# Altium footprint library 13-IC Packages-3pic1.PcbLib: 49 footprints (part 2 of 4)
Each footprint in its own frame and in the unit in brackets; x right, y up, seen from the top. Pads: shape width x height; smd on the part's side, far side on the other; paste and mask are expansions set on the pad; w line width, h text height; cw(c..) or ccw(c..) is an arc to the next point about the centre after c.
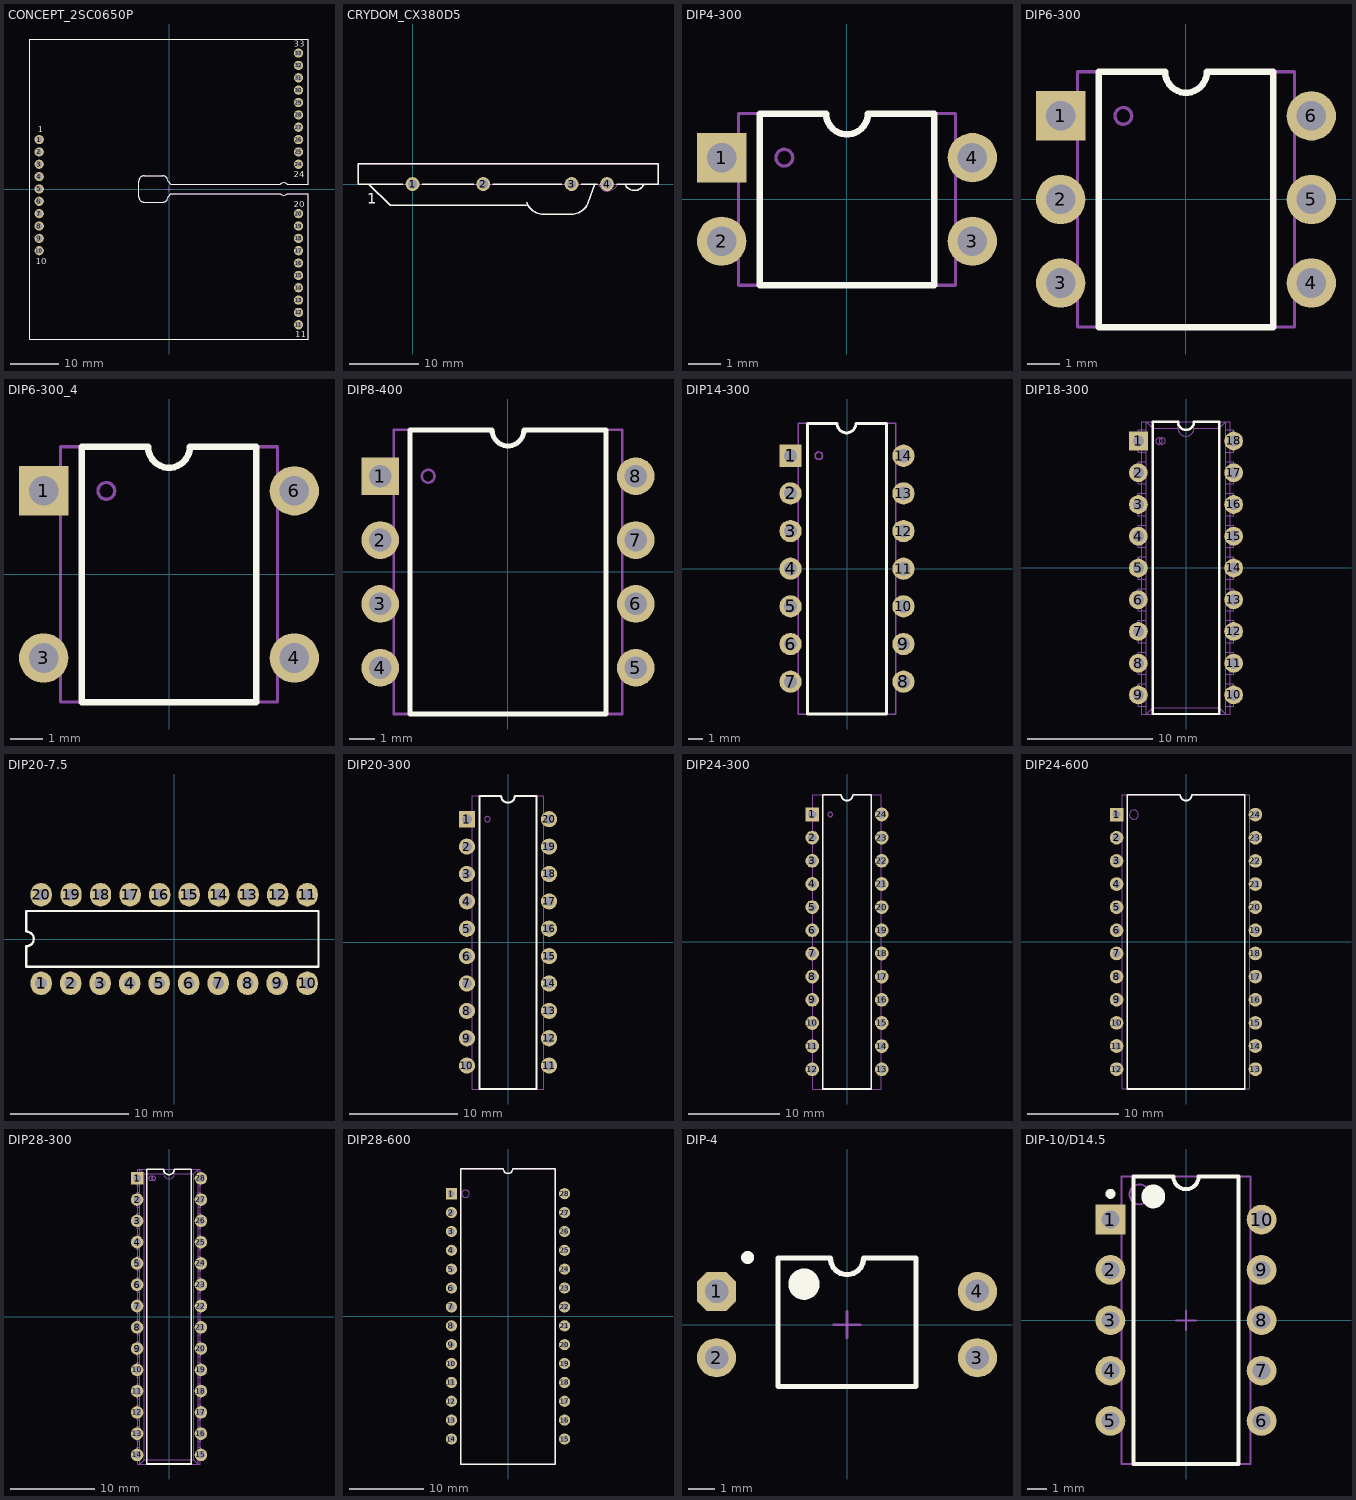
[diagram p1: the footprints below, top view; thin cyan lines are the x and y axes]

## CONCEPT_2SC0650P [mm] "Dual-Channel High-Power High-Frequency SCALE-2 Driver Core"
height 6.5
pads (30):
  round 1.9 hole 1.2: 1(-26.7,10.17) 2(-26.7,7.63) 3(-26.7,5.09) 4(-26.7,2.55) 5(-26.7,0.01) 6(-26.7,-2.53) 7(-26.7,-5.07) 8(-26.7,-7.61) 9(-26.7,-10.15) 10(-26.7,-12.69) 11(26.64,-27.93) 12(26.64,-25.39) 13(26.64,-22.85) 14(26.64,-20.31) 15(26.64,-17.77) 16(26.64,-15.23) 17(26.64,-12.69) 18(26.64,-10.15) 19(26.64,-7.61) 20(26.64,-5.07) 24(26.64,5.09) 25(26.64,7.63) 26(26.64,10.17) 27(26.64,12.71) 28(26.64,15.25) 29(26.64,17.79) 30(26.64,20.33) 31(26.64,22.87) 32(26.64,25.41) 33(26.64,27.95)
Top Overlay:
  lines w0.2: -28.6,-30.85 -28.6,30.85 28.6,30.85 28.6,1 24.35,1 ccw(c23.6,0) 22.85,1 0.4,1 -0.2,1.6 ccw(c-1.3,1.6) -1.3,2.7 -5.1,2.7 ccw(c-5.1,1.6) -6.2,1.6 -6.2,-1.6 ccw(c-5.1,-1.6) -5.1,-2.7 -1.3,-2.7 ccw(c-1.3,-1.6) -0.2,-1.6 0.4,-1 22.85,-1 ccw(c23.6,0) 24.35,-1 28.6,-1 28.6,-30.85 -28.6,-30.85
  text "11" at 25.94,-30.497 h1.27
  text "24" at 25.684,2.387 h1.27
  text "20" at 25.696,-3.767 h1.27
  text "33" at 25.696,29.253 h1.27
  text "10" at -27.453,-15.483 h1.27
  text "1" at -26.973,11.627 h1.27
Mechanical 8:
  lines w0.1: -27.2,-12.69 -26.7,-12.69 ; -27.2,-10.15 -26.7,-10.15 ; -27.2,-7.61 -26.7,-7.61 ; -27.2,-5.07 -26.7,-5.07 ; -27.2,-2.53 -26.7,-2.53 ; -27.2,0.01 -26.7,0.01 ; -27.2,2.55 -26.7,2.55 ; -27.2,5.09 -26.7,5.09 ; -27.2,7.63 -26.7,7.63 ; -27.2,10.17 -26.7,10.17 ; -26.7,-13.19 -26.7,-12.69 ; -26.7,-12.19 -26.7,-12.69 ; -26.7,-10.65 -26.7,-10.15 ; -26.7,-9.65 -26.7,-10.15 ; -26.7,-8.11 -26.7,-7.61 ; -26.7,-7.11 -26.7,-7.61 ; -26.7,-5.57 -26.7,-5.07 ; -26.7,-4.57 -26.7,-5.07 ; -26.7,-3.03 -26.7,-2.53 ; -26.7,-2.03 -26.7,-2.53 ; -26.7,-0.49 -26.7,0.01 ; -26.7,0.51 -26.7,0.01 ; -26.7,2.05 -26.7,2.55 ; -26.7,3.05 -26.7,2.55 ; -26.7,4.59 -26.7,5.09 ; -26.7,5.59 -26.7,5.09 ; -26.7,7.13 -26.7,7.63 ; -26.7,8.13 -26.7,7.63 ; -26.7,9.67 -26.7,10.17 ; -26.7,10.67 -26.7,10.17 ; -26.2,-12.69 -26.7,-12.69 ; -26.2,-10.15 -26.7,-10.15 ; -26.2,-7.61 -26.7,-7.61 ; -26.2,-5.07 -26.7,-5.07 ; -26.2,-2.53 -26.7,-2.53 ; -26.2,0.01 -26.7,0.01 ; -26.2,2.55 -26.7,2.55 ; -26.2,5.09 -26.7,5.09 ; -26.2,7.63 -26.7,7.63 ; -26.2,10.17 -26.7,10.17 ; -0.5,0 0,0 ; 0,-0.5 0,0 ; 0,0.5 0,0 ; 0.5,0 0,0 ; 26.14,-27.93 26.64,-27.93 ; 26.14,-25.39 26.64,-25.39 ; 26.14,-22.85 26.64,-22.85 ; 26.14,-20.31 26.64,-20.31 ; 26.14,-17.77 26.64,-17.77 ; 26.14,-15.23 26.64,-15.23 ; 26.14,-12.69 26.64,-12.69 ; 26.14,-10.15 26.64,-10.15 ; 26.14,-7.61 26.64,-7.61 ; 26.14,-5.07 26.64,-5.07 ; 26.14,5.09 26.64,5.09 ; 26.14,7.63 26.64,7.63 ; 26.14,10.17 26.64,10.17 ; 26.14,12.71 26.64,12.71 ; 26.14,15.25 26.64,15.25 ; 26.14,17.79 26.64,17.79 ; 26.14,20.33 26.64,20.33 ; 26.14,22.87 26.64,22.87 ; 26.14,25.41 26.64,25.41 ; 26.14,27.95 26.64,27.95 ; 26.64,-28.43 26.64,-27.93 ; 26.64,-27.43 26.64,-27.93 ; 26.64,-25.89 26.64,-25.39 ; 26.64,-24.89 26.64,-25.39 ; 26.64,-23.35 26.64,-22.85 ; 26.64,-22.35 26.64,-22.85 ; 26.64,-20.81 26.64,-20.31 ; 26.64,-19.81 26.64,-20.31 ; 26.64,-18.27 26.64,-17.77 ; 26.64,-17.27 26.64,-17.77 ; 26.64,-15.73 26.64,-15.23 ; 26.64,-14.73 26.64,-15.23 ; 26.64,-13.19 26.64,-12.69 ; 26.64,-12.19 26.64,-12.69 ; 26.64,-10.65 26.64,-10.15 ; 26.64,-9.65 26.64,-10.15 ; 26.64,-8.11 26.64,-7.61 ; 26.64,-7.11 26.64,-7.61 ; 26.64,-5.57 26.64,-5.07 ; 26.64,-4.57 26.64,-5.07 ; 26.64,4.59 26.64,5.09 ; 26.64,5.59 26.64,5.09 ; 26.64,7.13 26.64,7.63 ; 26.64,8.13 26.64,7.63 ; 26.64,9.67 26.64,10.17 ; 26.64,10.67 26.64,10.17 ; 26.64,12.21 26.64,12.71 ; 26.64,13.21 26.64,12.71 ; 26.64,14.75 26.64,15.25 ; 26.64,15.75 26.64,15.25 ; 26.64,17.29 26.64,17.79 ; 26.64,18.29 26.64,17.79 ; 26.64,19.83 26.64,20.33 ; 26.64,20.83 26.64,20.33 ; 26.64,22.37 26.64,22.87 ; 26.64,23.37 26.64,22.87 ; 26.64,24.91 26.64,25.41 ; 26.64,25.91 26.64,25.41 ; 26.64,27.45 26.64,27.95 ; 26.64,28.45 26.64,27.95 ; 27.14,-27.93 26.64,-27.93 ; 27.14,-25.39 26.64,-25.39 ; 27.14,-22.85 26.64,-22.85 ; 27.14,-20.31 26.64,-20.31 ; 27.14,-17.77 26.64,-17.77 ; 27.14,-15.23 26.64,-15.23 ; 27.14,-12.69 26.64,-12.69 ; 27.14,-10.15 26.64,-10.15 ; 27.14,-7.61 26.64,-7.61 ; 27.14,-5.07 26.64,-5.07 ; 27.14,5.09 26.64,5.09 ; 27.14,7.63 26.64,7.63 ; 27.14,10.17 26.64,10.17 ; 27.14,12.71 26.64,12.71 ; 27.14,15.25 26.64,15.25 ; 27.14,17.79 26.64,17.79 ; 27.14,20.33 26.64,20.33 ; 27.14,22.87 26.64,22.87 ; 27.14,25.41 26.64,25.41 ; 27.14,27.95 26.64,27.95
Mechanical 14:
  lines w0.1: -28.6,-30.85 -28.6,30.85 28.6,30.85 28.6,1 24.35,1 ccw(c23.6,0) 22.85,1 0.4,1 -0.2,1.6 ccw(c-1.3,1.6) -1.3,2.7 -5.1,2.7 ccw(c-5.1,1.6) -6.2,1.6 -6.2,-1.6 ccw(c-5.1,-1.6) -5.1,-2.7 -1.3,-2.7 ccw(c-1.3,-1.6) -0.2,-1.6 0.4,-1 22.85,-1 ccw(c23.6,0) 24.35,-1 28.6,-1 28.6,-30.85 -28.6,-30.85
  text "11" at 25.94,-30.497 h1.27
  text "24" at 25.684,2.387 h1.27
  text "20" at 25.696,-3.767 h1.27
  text "33" at 25.696,29.253 h1.27
  text "10" at -27.453,-15.483 h1.27
  text "1" at -26.973,11.627 h1.27
3D body "CONCEPT_2SC0650P.stp": height 6.68, standoff -2.54, extent -28.6,-30.85 28.6,30.85

## CRYDOM_CX380D5 [mm] "CRYDOM CX Serie, 4 Leads, Body 43.1 x 7.6mm, SIP Solid State Relay"
height 26.7
pads (4):
  round 2 hole 1.3: 1(0,0) 2(10.16,0) 3(22.86,0) 4(27.94,0)
Top Overlay:
  lines w0.2: -6.263,0 -3.215,-3.048 16.581,-3.048 ; -1.4,0 -7.834,0 -7.834,2.911 35.266,2.911 35.266,0 29.34,0 ; 1.4,0 8.76,0 ; 11.56,0 21.46,0 ; 16.379,-2.605 ccw(c18.781,-1.778) 18.781,-4.318 22.852,-4.318 ccw(c22.852,-1.778) 25.253,-2.605 26.15,0 ; 24.26,0 26.54,0 ; 30.534,0 ccw(c31.89,0.544) 33.11,-0.258 33.28,0
  text "1" at -6.5,-2.8 h1.5
Mechanical 8:
  lines w0.1: -0.5,0 0,0 ; 0,-0.5 0,0 ; 0,0.5 0,0 ; 0.5,0 0,0 ; 9.66,0 10.16,0 ; 10.16,-0.5 10.16,0 ; 10.16,0.5 10.16,0 ; 10.66,0 10.16,0 ; 22.36,0 22.86,0 ; 22.86,-0.5 22.86,0 ; 22.86,0.5 22.86,0 ; 23.36,0 22.86,0 ; 27.44,0 27.94,0 ; 27.94,-0.5 27.94,0 ; 27.94,0.5 27.94,0 ; 28.44,0 27.94,0
Mechanical 14:
  lines w0.1: -6.263,0 -3.215,-3.048 16.581,-3.048 ; 16.379,-2.605 ccw(c18.781,-1.778) 18.781,-4.318 22.852,-4.318 ccw(c22.852,-1.778) 25.253,-2.605 26.15,0 ; 26.695,0 26.936,-0.365 ccw(c28.08,0.544) 29.435,0 ; 27.053,-0.495 ccw(c27.94,0) 28.48,-0.861 ; 30.534,0 ccw(c31.89,0.544) 33.11,-0.258 33.28,0 ; -7.834,0 35.266,0 35.266,2.911 -7.834,2.911 -7.834,0
  text "1" at -6.5,-2.8 h1.5
3D body "CRYDOM_CX380D5.stp": height 26.7, standoff -5.08, extent -7.834,-4.318 35.266,2.911

## DIP4-300 [mm] "DIP 4 Leads, Row Spacing 7.62 mm; Pitch 2.54 mm"
height 5.08
pads (4):
  rect 1.5x1.5 hole 0.9: 1(-3.81,1.27)
  round 1.5 hole 0.9: 2(-3.81,-1.27) 3(3.81,-1.27) 4(3.81,1.27)
Top Overlay:
  lines w0.2: -0.635,2.61 ccw(c0,2.61) 0.635,2.61 ; -0.635,2.61 ccw(c0,2.61) 0.635,2.61 ; -0.635,2.61 -2.65,2.61 -2.65,-2.61 2.65,-2.61 2.65,2.61 0.635,2.61
Mechanical 14:
  circle w0.1: c-1.905,1.27 r0.254
  lines w0.1: -3.3,-2.61 -3.3,2.61 -0.635,2.61 ccw(c0,2.61) 0.635,2.61 3.3,2.61 3.3,-2.61 -3.3,-2.61
3D body "DIP4-300.stp": height 5.33, standoff -3.3, extent -3.935,-2.54 3.935,2.54

## DIP6-300 [mm] "DIP 6 Leads, Row Spacing 7.62 mm; Pitch 2.54 mm"
height 5.08
pads (6):
  rect 1.5x1.5 hole 0.9: 1(-3.81,2.54)
  round 1.5 hole 0.9: 2(-3.81,0) 3(-3.81,-2.54) 4(3.81,-2.54) 5(3.81,0) 6(3.81,2.54)
Top Overlay:
  lines w0.2: -0.635,3.88 ccw(c0,3.88) 0.635,3.88 ; -0.635,3.88 ccw(c0,3.88) 0.635,3.88 ; -0.635,3.88 -2.65,3.88 -2.65,-3.88 2.65,-3.88 2.65,3.88 0.635,3.88
Mechanical 14:
  circle w0.1: c-1.905,2.54 r0.254
  lines w0.1: -3.3,-3.88 -3.3,3.88 -0.635,3.88 ccw(c0,3.88) 0.635,3.88 3.3,3.88 3.3,-3.88 -3.3,-3.88
3D body "DIP6-300.stp": height 5.33, standoff -3.3, extent -3.935,-3.81 3.935,3.81

## DIP6-300_4 [mm] "DIP 6, 4 Leads, Row Spacing 7.62 mm; Pitch 2.54 mm"
height 5.08
pads (4):
  rect 1.5x1.5 hole 0.9: 1(-3.81,2.54)
  round 1.5 hole 0.9: 3(-3.81,-2.54) 4(3.81,-2.54) 6(3.81,2.54)
Top Overlay:
  lines w0.2: -0.635,3.88 ccw(c0,3.88) 0.635,3.88 ; -0.635,3.88 ccw(c0,3.88) 0.635,3.88 ; -0.635,3.88 -2.65,3.88 -2.65,-3.88 2.65,-3.88 2.65,3.88 0.635,3.88
Mechanical 14:
  circle w0.1: c-1.905,2.54 r0.254
  lines w0.1: -3.3,-3.88 -3.3,3.88 -0.67,3.88 ccw(c-0.035,3.88) 0.6,3.88 3.3,3.88 3.3,-3.88 -3.3,-3.88
3D body "DIP6-300_4.stp": height 5.33, standoff -3.3, extent -3.935,-3.81 3.935,3.81

## DIP8-400 [mm] "DIP 8 Leads, Row Spacing 10.16mm; Pitch 2.54 mm"
height 5.08
pads (8):
  rect 1.5x1.5 hole 0.9: 1(-5.08,3.81)
  round 1.5 hole 0.9: 2(-5.08,1.27) 3(-5.08,-1.27) 4(-5.08,-3.81) 5(5.08,-3.81) 6(5.08,-1.27) 7(5.08,1.27) 8(5.08,3.81)
Top Overlay:
  lines w0.2: -3.9,-5.65 -3.9,5.65 -0.635,5.65 ccw(c0,5.65) 0.635,5.65 3.9,5.65 3.9,-5.65 -3.9,-5.65
Mechanical 14:
  circle w0.1: c-3.175,3.81 r0.254
  lines w0.1: -4.55,-5.65 4.55,-5.65 4.55,5.65 0.62,5.65 cw(c-0.015,5.65) -0.65,5.65 -4.55,5.65 -4.55,-5.65
3D body "DIP8-400.stp": height 5.33, standoff -3.3, extent -5.205,-5.65 5.205,5.65

## DIP14-300 [mm] "DIP 14 Leads, Row Spacing 7.62 mm; Pitch 2.54 mm"
height 5.08
pads (14):
  rect 1.5x1.5 hole 0.9: 1(-3.81,7.62)
  round 1.5 hole 0.9: 2(-3.81,5.08) 3(-3.81,2.54) 4(-3.81,0) 5(-3.81,-2.54) 6(-3.81,-5.08) 7(-3.81,-7.62) 8(3.81,-7.62) 9(3.81,-5.08) 10(3.81,-2.54) 11(3.81,0) 12(3.81,2.54) 13(3.81,5.08) 14(3.81,7.62)
Top Overlay:
  lines w0.2: -0.685,9.8 -2.65,9.8 -2.65,-9.8 2.65,-9.8 2.65,9.8 ; -0.67,9.8 ccw(c-0.035,9.8) 0.6,9.8 2.615,9.8
Mechanical 14:
  circle w0.1: c-1.905,7.62 r0.254
  lines w0.1: -3.3,-9.8 -3.3,9.8 -0.67,9.8 ccw(c-0.035,9.8) 0.6,9.8 3.3,9.8 3.3,-9.8 -3.3,-9.8
3D body "DIP14-300.stp": height 5.33, standoff -3.3, extent -3.935,-9.845 3.935,9.845

## DIP18-300 [mm] "DIP 18 Leads, Row Spacing 7.62 mm; Pitch 2.54 mm"
height 5.08
pads (18):
  rect 1.5x1.5 hole 0.9: 1(-3.81,10.16)
  round 1.5 hole 0.9: 2(-3.81,7.62) 3(-3.81,5.08) 4(-3.81,2.54) 5(-3.81,0) 6(-3.81,-2.54) 7(-3.81,-5.08) 8(-3.81,-7.62) 9(-3.81,-10.16) 10(3.81,-10.16) 11(3.81,-7.62) 12(3.81,-5.08) 13(3.81,-2.54) 14(3.81,0) 15(3.81,2.54) 16(3.81,5.08) 17(3.81,7.62) 18(3.81,10.16)
Top Overlay:
  lines w0.2: -2.65,-11.685 2.65,-11.685 2.65,11.685 0.635,11.685 cw(c0,11.685) -0.635,11.685 -2.65,11.685 -2.65,-11.685
Mechanical 8:
  circle w0.05: c-2.159,10.16 r0.254
  lines w0.05: -3.175,-11.05 -3.81,-11.05 -3.81,-10.44 -3.935,-10.44 -3.935,-9.88 -3.81,-9.88 -3.81,-9.27 -3.175,-9.27 ; -3.175,-8.51 -3.81,-8.51 -3.81,-7.9 -3.935,-7.9 -3.935,-7.34 -3.81,-7.34 -3.81,-6.73 -3.175,-6.73 ; -3.175,-5.97 -3.81,-5.97 -3.81,-5.36 -3.935,-5.36 -3.935,-4.8 -3.81,-4.8 -3.81,-4.19 -3.175,-4.19 ; -3.175,-3.43 -3.81,-3.43 -3.81,-2.82 -3.935,-2.82 -3.935,-2.26 -3.81,-2.26 -3.81,-1.65 -3.175,-1.65 ; -3.175,-0.89 -3.81,-0.89 -3.81,-0.28 -3.935,-0.28 -3.935,0.28 -3.81,0.28 -3.81,0.89 -3.175,0.89 ; -3.175,1.65 -3.81,1.65 -3.81,2.26 -3.935,2.26 -3.935,2.82 -3.81,2.82 -3.81,3.43 -3.175,3.43 ; -3.175,4.19 -3.81,4.19 -3.81,4.8 -3.935,4.8 -3.935,5.36 -3.81,5.36 -3.81,5.97 -3.175,5.97 ; -3.175,6.73 -3.81,6.73 -3.81,7.34 -3.935,7.34 -3.935,7.9 -3.81,7.9 -3.81,8.51 -3.175,8.51 ; -3.175,9.27 -3.81,9.27 -3.81,9.88 -3.935,9.88 -3.935,10.44 -3.81,10.44 -3.81,11.05 -3.175,11.05 ; -0.635,11.685 -0.635,11.177 ; 0.635,11.685 0.635,11.177 ; 3.175,-11.05 3.81,-11.05 3.81,-10.44 3.935,-10.44 3.935,-9.88 3.81,-9.88 3.81,-9.27 3.175,-9.27 ; 3.175,-8.51 3.81,-8.51 3.81,-7.9 3.935,-7.9 3.935,-7.34 3.81,-7.34 3.81,-6.73 3.175,-6.73 ; 3.175,-5.97 3.81,-5.97 3.81,-5.36 3.935,-5.36 3.935,-4.8 3.81,-4.8 3.81,-4.19 3.175,-4.19 ; 3.175,-3.43 3.81,-3.43 3.81,-2.82 3.935,-2.82 3.935,-2.26 3.81,-2.26 3.81,-1.65 3.175,-1.65 ; 3.175,-0.89 3.81,-0.89 3.81,-0.28 3.935,-0.28 3.935,0.28 3.81,0.28 3.81,0.89 3.175,0.89 ; 3.175,1.65 3.81,1.65 3.81,2.26 3.935,2.26 3.935,2.82 3.81,2.82 3.81,3.43 3.175,3.43 ; 3.175,4.19 3.81,4.19 3.81,4.8 3.935,4.8 3.935,5.36 3.81,5.36 3.81,5.97 3.175,5.97 ; 3.175,6.73 3.81,6.73 3.81,7.34 3.935,7.34 3.935,7.9 3.81,7.9 3.81,8.51 3.175,8.51 ; 3.175,9.27 3.81,9.27 3.81,9.88 3.935,9.88 3.935,10.44 3.81,10.44 3.81,11.05 3.175,11.05 ; -3.175,-11.685 3.175,-11.685 ; -3.175,-11.685 -3.175,11.685 ; -3.175,-11.685 -2.667,-11.177 ; -3.175,11.685 3.175,11.685 ; -3.175,11.685 -2.667,11.177 ; -2.667,-11.177 2.667,-11.177 ; -2.667,-11.177 -2.667,11.177 ; -2.667,11.177 -0.635,11.177 ; -0.635,11.177 ccw(c0,11.177) 0.635,11.177 ; 0.635,11.177 2.667,11.177 ; 2.667,-11.177 2.667,11.177 ; 2.667,-11.177 3.175,-11.685 ; 2.667,11.177 3.175,11.685 ; 3.175,-11.685 3.175,11.685
Mechanical 14:
  circle w0.1: c-1.905,10.16 r0.254
  lines w0.1: -3.555,-11.685 -3.555,11.685 -0.635,11.685 ccw(c0,11.685) 0.635,11.685 3.555,11.685 3.555,-11.685 -3.555,-11.685
3D body "DIP18-300.stp": height 5.33, standoff -3.3, extent -3.935,-11.685 3.935,11.685

## DIP20-7.5 [mm]
height 5.08
pads (20):
  oval 1.8x2 hole 1: 1(-11.27,-3.75) 2(-8.77,-3.75) 3(-6.27,-3.75) 4(-3.77,-3.75) 5(-1.27,-3.75) 6(1.23,-3.75) 7(3.73,-3.75) 8(6.23,-3.75) 9(8.73,-3.75) 10(11.27,-3.75) 11(11.27,3.75) 12(8.77,3.75) 13(6.27,3.75) 14(3.77,3.75) 15(1.27,3.75) 16(-1.23,3.75) 17(-3.73,3.75) 18(-6.23,3.75) 19(-8.73,3.75) 20(-11.27,3.75)
Top Overlay:
  lines w0.2: -12.52,-2.36 -12.52,-0.62 ccw(c-12.52,0.005) -12.52,0.63 -12.52,2.37 12.23,2.37 12.23,-2.36 -12.52,-2.36
3D body "DIP20-300.stp": height 5.33, standoff -3.3, extent -13.435,-3.884 13.485,3.986

## DIP20-300 [mm] "DIP 20 Leads, Row Spacing 7.62 mm; Pitch 2.54 mm"
height 5.08
pads (20):
  rect 1.5x1.5 hole 0.9: 1(-3.81,11.43)
  round 1.5 hole 0.9: 2(-3.81,8.89) 3(-3.81,6.35) 4(-3.81,3.81) 5(-3.81,1.27) 6(-3.81,-1.27) 7(-3.81,-3.81) 8(-3.81,-6.35) 9(-3.81,-8.89) 10(-3.81,-11.43) 11(3.81,-11.43) 12(3.81,-8.89) 13(3.81,-6.35) 14(3.81,-3.81) 15(3.81,-1.27) 16(3.81,1.27) 17(3.81,3.81) 18(3.81,6.35) 19(3.81,8.89) 20(3.81,11.43)
Top Overlay:
  lines w0.2: -2.65,-13.6 2.65,-13.6 2.65,13.6 0.635,13.6 cw(c0,13.6) -0.635,13.6 -2.65,13.6 -2.65,-13.6
Mechanical 14:
  circle w0.1: c-1.905,11.43 r0.254
  lines w0.1: -3.3,-13.6 3.3,-13.6 3.3,13.6 0.6,13.6 cw(c-0.035,13.6) -0.67,13.6 -3.3,13.6 -3.3,-13.6
3D body "DIP20-300.stp": height 5.33, standoff -3.3, extent -3.935,-13.46 3.935,13.46

## DIP24-300 [mm] "DIP 24 Leads, Row Spacing 7.62mm; Pitch 2.54mm"
height 5.08
pads (24):
  rect 1.5x1.5 hole 0.9: 1(-3.81,13.97)
  round 1.5 hole 0.9: 2(-3.81,11.43) 3(-3.81,8.89) 4(-3.81,6.35) 5(-3.81,3.81) 6(-3.81,1.27) 7(-3.81,-1.27) 8(-3.81,-3.81) 9(-3.81,-6.35) 10(-3.81,-8.89) 11(-3.81,-11.43) 12(-3.81,-13.97) 13(3.81,-13.97) 14(3.81,-11.43) 15(3.81,-8.89) 16(3.81,-6.35) 17(3.81,-3.81) 18(3.81,-1.27) 19(3.81,1.27) 20(3.81,3.81) 21(3.81,6.35) 22(3.81,8.89) 23(3.81,11.43) 24(3.81,13.97)
Top Overlay:
  lines w0.2: -2.65,-16.13 2.65,-16.13 2.65,16.13 0.635,16.13 cw(c0,16.13) -0.635,16.13 -2.65,16.13 -2.65,-16.13
Mechanical 14:
  circle w0.1: c-1.84,13.97 r0.254
  lines w0.1: -3.745,-16.13 3.745,-16.13 3.745,16.13 0.635,16.13 cw(c0,16.13) -0.635,16.13 -3.745,16.13 -3.745,-16.13
3D body "DIP24-300.stp": height 5.08, standoff -3.3, extent -3.935,-16.13 3.935,16.13

## DIP24-600 [mm] "24 Leads Dual In-Line Package, Row Spacing 15.24mm; Pitch 2.54mm"
height 5.1
pads (24):
  rect 1.5x1.5 hole 0.9: 1(-7.62,13.97)
  round 1.5 hole 0.9: 2(-7.62,11.43) 3(-7.62,8.89) 4(-7.62,6.35) 5(-7.62,3.81) 6(-7.62,1.27) 7(-7.62,-1.27) 8(-7.62,-3.81) 9(-7.62,-6.35) 10(-7.62,-8.89) 11(-7.62,-11.43) 12(-7.62,-13.97) 13(7.62,-13.97) 14(7.62,-11.43) 15(7.62,-8.89) 16(7.62,-6.35) 17(7.62,-3.81) 18(7.62,-1.27) 19(7.62,1.27) 20(7.62,3.81) 21(7.62,6.35) 22(7.62,8.89) 23(7.62,11.43) 24(7.62,13.97)
Top Overlay:
  lines w0.2: -6.45,-16.15 -6.45,16.15 -0.635,16.15 ccw(c0,16.15) 0.635,16.15 6.45,16.15 6.45,-16.15 -6.45,-16.15
Mechanical 14:
  circle w0.1: c-5.715,13.97 r0.5
  lines w0.1: -7,-16.15 -7,16.15 -0.635,16.15 ccw(c0,16.15) 0.635,16.15 7,16.15 7,-16.15 -7,-16.15
3D body "DIP24-600.stp": height 5.72, standoff -3.3, extent -7.745,-16 7.745,16

## DIP28-300 [mm] "DIP 28 Leads, Row Spacing 7.62mm; Pitch 2.54mm"
height 4.57
pads (28):
  rect 1.5x1.5 hole 0.9: 1(-3.81,16.51)
  round 1.5 hole 0.9: 2(-3.81,13.97) 3(-3.81,11.43) 4(-3.81,8.89) 5(-3.81,6.35) 6(-3.81,3.81) 7(-3.81,1.27) 8(-3.81,-1.27) 9(-3.81,-3.81) 10(-3.81,-6.35) 11(-3.81,-8.89) 12(-3.81,-11.43) 13(-3.81,-13.97) 14(-3.81,-16.51) 15(3.81,-16.51) 16(3.81,-13.97) 17(3.81,-11.43) 18(3.81,-8.89) 19(3.81,-6.35) 20(3.81,-3.81) 21(3.81,-1.27) 22(3.81,1.27) 23(3.81,3.81) 24(3.81,6.35) 25(3.81,8.89) 26(3.81,11.43) 27(3.81,13.97) 28(3.81,16.51)
Top Overlay:
  lines w0.2: -2.65,-17.59 -2.65,17.59 -0.635,17.59 ccw(c0,17.59) 0.635,17.59 2.65,17.59 2.65,-17.59 -2.65,-17.59
Mechanical 8:
  drawing of 205 lines, arcs and shapes, not listed
Mechanical 14:
  circle w0.1: c-1.84,16.51 r0.254
  lines w0.1: -3.745,-17.59 -3.745,17.59 -0.635,17.59 ccw(c0,17.59) 0.635,17.59 3.745,17.59 3.745,-17.59 -3.745,-17.59
3D body "DIP28-300.stp": height 4.57, standoff -3.3, extent -3.935,-17.59 3.935,17.59

## DIP28-600 [mm] "28 Leads Dual In-Line Package, Row Spacing 15.24mm; Pitch 2.54mm"
height 5.59
pads (28):
  rect 1.5x1.5 hole 0.9: 1(-7.62,16.51)
  round 1.5 hole 0.9: 2(-7.62,13.97) 3(-7.62,11.43) 4(-7.62,8.89) 5(-7.62,6.35) 6(-7.62,3.81) 7(-7.62,1.27) 8(-7.62,-1.27) 9(-7.62,-3.81) 10(-7.62,-6.35) 11(-7.62,-8.89) 12(-7.62,-11.43) 13(-7.62,-13.97) 14(-7.62,-16.51) 15(7.62,-16.51) 16(7.62,-13.97) 17(7.62,-11.43) 18(7.62,-8.89) 19(7.62,-6.35) 20(7.62,-3.81) 21(7.62,-1.27) 22(7.62,1.27) 23(7.62,3.81) 24(7.62,6.35) 25(7.62,8.89) 26(7.62,11.43) 27(7.62,13.97) 28(7.62,16.51)
Top Overlay:
  lines w0.2: -6.35,-19.875 -6.35,19.875 -0.635,19.875 ccw(c0,19.875) 0.635,19.875 6.35,19.875 6.35,-19.875 -6.35,-19.875
Mechanical 14:
  circle w0.1: c-5.715,16.51 r0.5
  lines w0.1: -6.35,-19.875 -6.35,19.875 -0.635,19.875 ccw(c0,19.875) 0.635,19.875 6.35,19.875 6.35,-19.875 -6.35,-19.875
3D body "DIP28-600.stp": height 5.33, standoff -3.3, extent -7.745,-19.875 7.745,19.875

## DIP-4 [mm] "DIP; 4 Leads; Row Spacing 7.62 mm; Pitch 2.54 mm"
height 5.6
pads (4):
  oct 1.5x1.5 hole 0.9: 1(-5,1.27)
  round 1.5 hole 0.9 mask+0.07: 2(-5,-1.27) 3(5,-1.27) 4(5,1.27)
Top Overlay:
  circle w0.6: c-1.65,1.55 r0.3
  circle w0.25: c-3.81,2.57 r0.125
  lines w0.2: -2.65,-2.375 2.65,-2.375 2.65,2.55 0.635,2.55 cw(c0,2.55) -0.635,2.55 -2.65,2.55 -2.65,-2.375
Mechanical 15:
  lines w0.1: -0.5,0 0.5,0 ; 0,-0.5 0,0.5
3D body "pc817.stp": height 4, standoff -2, extent -5.207,-2.277 5.183,2.303
3D body "2_1.stp": height 0.02, standoff -1.6, extent 4.007,-2.248 6.007,-0.248
3D body "2_1.stp": height 0.02, standoff -1.6, extent 4.007,0.292 6.007,2.292
3D body "2_1.stp": height 0.02, standoff -1.6, extent -5.993,0.292 -3.993,2.292
3D body "2_1.stp": height 0.02, standoff -1.6, extent -5.993,-2.248 -3.993,-0.248

## DIP-10/D14.5 [mm] "DIP; 10 Leads; Row Spacing 7.62 mm; Pitch 2.54 mm"
height 5.08
pads (10):
  rect 1.5x1.5 hole 0.9: 1(-3.81,5.08)
  round 1.5 hole 0.9 mask+0.07: 2(-3.81,2.54) 3(-3.81,0) 4(-3.81,-2.54) 5(-3.81,-5.08) 6(3.81,-5.08) 7(3.81,-2.54) 8(3.81,0) 9(3.81,2.54) 10(3.81,5.08)
Top Overlay:
  circle w0.6: c-1.65,6.25 r0.3
  circle w0.25: c-3.81,6.38 r0.125
  lines w0.2: -2.65,-7.25 2.65,-7.25 2.65,7.25 0.635,7.25 cw(c0,7.25) -0.635,7.25 -2.65,7.25 -2.65,-7.25
Mechanical 13:
  circle w0.1: c-2.35,6.35 r0.5
  lines w0.1: -3.25,-7.25 3.25,-7.25 3.25,7.25 -3.25,7.25 -3.25,-7.25
Mechanical 15:
  lines w0.1: -0.5,0 0.5,0 ; 0,-0.5 0,0.5
3D body: height 5.08, standoff 0, extent -3.25,-7.25 3.25,7.25